# Altium footprint library PCB_Footprints.PcbLib: 303 footprints (part 8 of 19)
Each footprint in its own frame and in the unit in brackets; x right, y up, seen from the top. Pads: shape width x height; smd on the part's side, far side on the other; paste and mask are expansions set on the pad; w line width, h text height; cw(c..) or ccw(c..) is an arc to the next point about the centre after c.
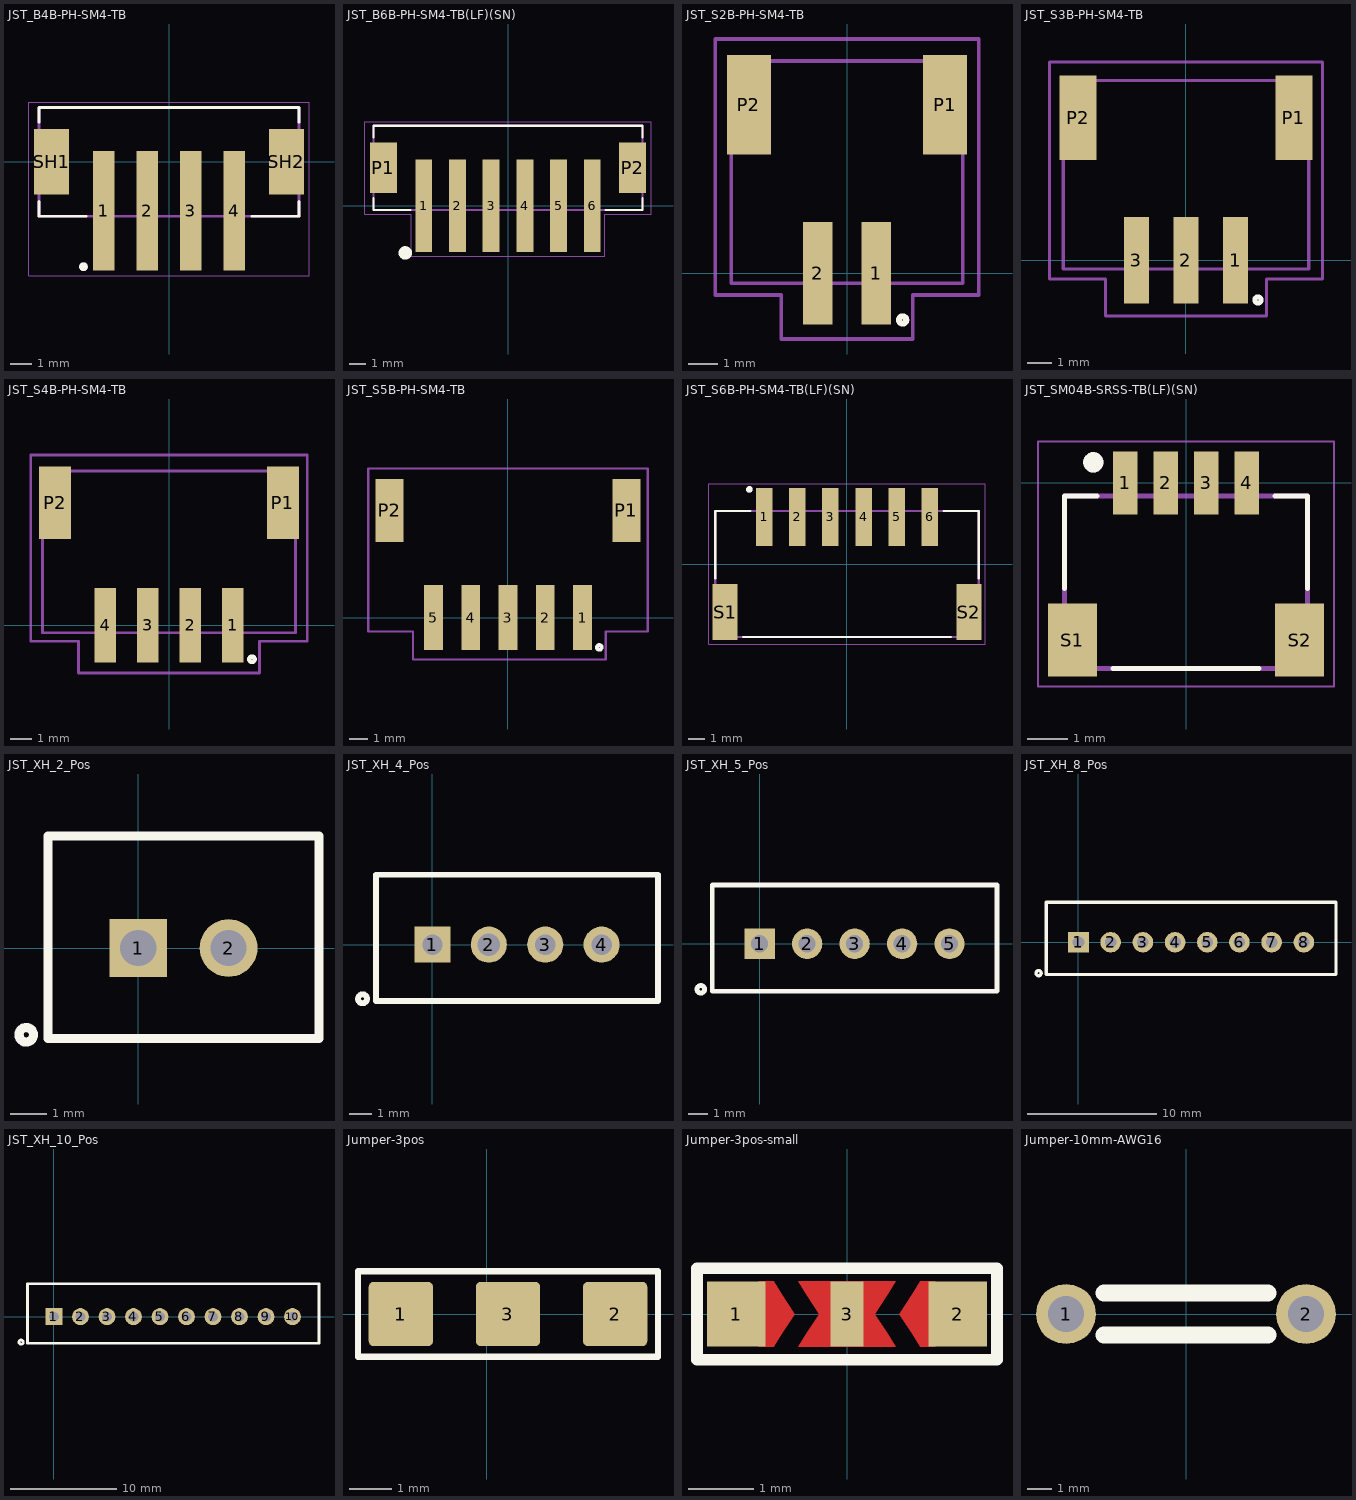
[diagram p7: the footprints below, top view; thin cyan lines are the x and y axes]

## JST_B4B-PH-SM4-TB [mm]
height 6.6
pads (6):
  rect 1x5.5 smd mask+0.05: 1(-3,-2.25) 2(-1,-2.25) 3(1,-2.25) 4(3,-2.25)
  rect 1.6x3 smd mask+0.05: SH1(-5.4,0) SH2(5.4,0)
Top Overlay:
  circle w0.2: c-3.937,-4.826 r0.1
  lines w0.127: -5.975,-1.82 -5.975,-2.5 -3.82,-2.5 ; -5.975,1.82 -5.975,2.5 5.975,2.5 5.975,1.82 ; 3.82,-2.5 5.975,-2.5 5.975,-1.82
Mechanical 13:
  circle w0.2: c-3.937,-4.826 r0.1
  lines w0.127: -5.975,-2.5 -5.975,2.5 5.975,2.5 5.975,-2.5 -5.975,-2.5
Mechanical 15:
  lines w0.05: -6.45,-5.25 6.45,-5.25 6.45,2.75 -6.45,2.75 -6.45,-5.25
3D body "step_temp.STEP": height 6.75, standoff 0, extent -5.975,-4.5 5.975,2.5

## JST_B6B-PH-SM4-TB(LF)(SN) [mm]
pads (8):
  rect 1x5.5 smd: 1(-5,0) 2(-3,0) 3(-1,0) 4(1,0) 5(3,0) 6(5,0)
  rect 1.6x3 smd: P1(-7.4,2.25) P2(7.4,2.25)
Top Overlay:
  circle w0.4: c-6.096,-2.794 r0.2
  lines w0.127: -7.975,0.45 -7.975,-0.25 -5.8,-0.25 ; -7.975,4.05 -7.975,4.75 7.975,4.75 7.975,4.05 ; 5.8,-0.25 7.975,-0.25 7.975,0.45
Mechanical 13:
  lines w0.127: -7.975,-0.25 7.975,-0.25 7.975,4.75 -7.975,4.75 -7.975,-0.25
Mechanical 15:
  lines w0.05: -8.5,-0.5 -5.75,-0.5 -5.75,-3 5.75,-3 5.75,-0.5 8.5,-0.5 8.5,5 -8.5,5 -8.5,-0.5
3D body "B6B-PH-SM4-TB_LF__SN_.step": height 6.6, standoff -0.15, extent -7.949,-2.286 8.001,4.714

## JST_S2B-PH-SM4-TB [mm]
pads (4):
  rect 1x3.5 smd: 1(1,0) 2(-1,0)
  rect 1.5x3.4 smd: P1(3.35,5.75) P2(-3.35,5.75)
Top Overlay:
  circle w0.2: c1.9,-1.6 r0.127
Mechanical 13:
  lines w0.127: -3.95,-0.35 3.95,-0.35 3.95,7.25 -3.95,7.25 -3.95,-0.35
Mechanical 15:
  lines w0.127: -4.5,-0.75 -2.25,-0.75 -2.25,-2.25 2.25,-2.25 2.25,-0.75 4.5,-0.75 4.5,8 -4.5,8 -4.5,-0.75
3D body "S2B-PH-SM4-TB--3DModel-STEP-269445.STEP": height 5.5, standoff -0.1, extent -3.963,-1.379 3.937,7.221

## JST_S3B-PH-SM4-TB [mm]
pads (5):
  rect 1x3.5 smd: 1(2,0) 2(0,0) 3(-2,0)
  rect 1.5x3.4 smd: P1(4.35,5.75) P2(-4.35,5.75)
Top Overlay:
  circle w0.2: c2.9,-1.6 r0.127
Mechanical 13:
  lines w0.127: -4.95,-0.35 -4.95,7.25 4.95,7.25 4.95,-0.35 -4.95,-0.35
Mechanical 15:
  lines w0.127: -5.5,-0.75 -5.5,8 5.5,8 5.5,-0.75 3.25,-0.75 3.25,-2.25 -3.25,-2.25 -3.25,-0.75 -5.5,-0.75
3D body "S3B-PH-SM4-TB--3DModel-STEP-269445.STEP": height 5.5, standoff -0.1, extent -4.95,-1.361 4.95,7.239

## JST_S4B-PH-SM4-TB [mm]
pads (6):
  rect 1x3.5 smd: 1(3,0) 2(1,0) 3(-1,0) 4(-3,0)
  rect 1.5x3.4 smd: P1(5.35,5.75) P2(-5.35,5.75)
Top Overlay:
  circle w0.2: c3.9,-1.6 r0.127
Mechanical 13:
  lines w0.127: -5.95,-0.35 -5.95,7.25 5.95,7.25 5.95,-0.35 -5.95,-0.35
Mechanical 15:
  lines w0.127: -6.5,-0.75 -6.5,8 6.5,8 6.5,-0.75 4.25,-0.75 4.25,-2.25 -4.25,-2.25 -4.25,-0.75 -6.5,-0.75
3D body "S4B-PH-SM4-TB--3DModel-STEP-56544.STEP": height 5.5, standoff -0.1, extent -5.95,-1.379 5.95,7.221

## JST_S5B-PH-SM4-TB [mm]
pads (7):
  rect 1x3.5 smd: 1(4,0) 2(2,0) 3(0,0) 4(-2,0) 5(-4,0)
  rect 1.5x3.4 smd: P1(6.35,5.75) P2(-6.35,5.75)
Top Overlay:
  circle w0.2: c4.9,-1.6 r0.127
Mechanical 15:
  lines w0.127: -7.493,-0.75 -5.096,-0.75 -5.096,-2.25 5.25,-2.25 5.25,-0.75 7.5,-0.75 7.5,8 -7.493,8 -7.493,-0.75
3D body "S5B-PH-SM4-TB--3DModel-STEP-56544.STEP": height 5.6, standoff 0, extent -6.95,-1.143 6.95,7.457

## JST_S6B-PH-SM4-TB(LF)(SN) [mm]
pads (8):
  rect 1x3.5 smd: 1(-5,2.875) 2(-3,2.875) 3(-1,2.875) 4(1,2.875) 5(3,2.875) 6(5,2.875)
  rect 1.5x3.4 smd: S1(-7.35,-2.875) S2(7.35,-2.875)
Top Overlay:
  circle w0.3: c-5.889,4.526 r0.05
  lines w0.127: -7.95,-0.855 -7.95,3.225 -5.82,3.225 ; -6.28,-4.375 6.28,-4.375 ; 5.82,3.225 7.95,3.225 7.95,-0.855
Mechanical 13:
  lines w0.127: -7.95,-4.375 -7.95,3.225 7.95,3.225 7.95,-4.375 -7.95,-4.375
  lines w0.3: -5.926,4.492 ccw(c-5.889,4.526) -5.839,4.526
Mechanical 15:
  lines w0.05: -8.35,-4.825 -8.35,4.875 8.35,4.875 8.35,-4.825 -8.35,-4.825
3D body "S6B-PH-SM4-TB(LF)(SN)--3DModel-STEP-56544.STEP": height 5.5, standoff -0.1, extent -7.87,-4.346 8.03,4.254

## JST_SM04B-SRSS-TB(LF)(SN) [mm]
pads (6):
  rect 0.6x1.55 smd: 1(-1.5,0) 2(-0.5,0) 3(0.5,0) 4(1.5,0)
  rect 1.2x1.8 smd: S1(-2.8,-3.875) S2(2.8,-3.875)
Top Overlay:
  circle w0.3: c-2.286,0.508 r0.1
  lines w0.127: -3,-2.6 -3,-0.325 -2.2,-0.325 ; -1.8,-4.575 1.8,-4.575 ; 2.2,-0.325 3,-0.325 3,-2.6
Mechanical 13:
  circle w0.3: c-2.286,0.508 r0.1
  lines w0.127: -3,-4.575 3,-4.575 3,-0.325 -3,-0.325 -3,-4.575
Mechanical 15:
  lines w0.05: -3.65,-5.025 3.65,-5.025 3.65,1.025 -3.65,1.025 -3.65,-5.025
3D body "SM04B-SRSS-TB_LF__SN_.step": height 2.96, standoff 0, extent -3,-4.572 3,0.377

## JST_XH_2_Pos [mm]
pads (2):
  rect 1.6x1.6 hole 1: 1(0,0)
  round 1.6 hole 1: 2(2.5,0)
Top Overlay:
  circle w0.254: c-3.1,-2.4 r0.2
  lines w0.254: -2.5,-2.5 -2.5,3.1 5,3.1 5,-2.5 -2.5,-2.5
3D body "B2B-XH-A-LF.STEP": height 7, standoff -3.4, extent -2.45,-2.35 4.95,3.4

## JST_XH_4_Pos [mm]
pads (4):
  rect 1.6x1.6 hole 0.9: 1(0,0)
  round 1.6 hole 1: 2(2.5,0)
  round 1.6 hole 0.9: 3(5,0) 4(7.5,0)
Top Overlay:
  circle w0.254: c-3.1,-2.4 r0.2
  lines w0.254: -2.5,-2.5 10,-2.5 10,3.1 -2.5,3.1 -2.5,-2.5
3D body "B4B-XH-A-LF--SN.STEP": height 7, standoff -3.4, extent -2.45,-2.35 9.95,3.4

## JST_XH_5_Pos [mm]
pads (5):
  rect 1.6x1.6 hole 0.9: 1(0,0)
  round 1.6 hole 0.9: 2(2.5,0) 3(5,0) 4(7.5,0) 5(10,0)
Top Overlay:
  circle w0.254: c-3.1,-2.4 r0.2
  lines w0.254: -2.5,-2.5 12.5,-2.5 12.5,3.1 -2.5,3.1 -2.5,-2.5
3D body "B5B-XH-A.STEP": height 7, standoff -3.4, extent -2.45,-2.375 12.45,3.375

## JST_XH_8_Pos [mm]
pads (8):
  rect 1.6x1.6 hole 0.9: 1(0,0)
  round 1.6 hole 0.9: 2(2.5,0) 3(5,0) 4(7.5,0) 5(10,0) 6(12.5,0) 7(15,0) 8(17.5,0)
Top Overlay:
  circle w0.254: c-3.1,-2.4 r0.2
  lines w0.254: -2.5,-2.5 -2.5,3.1 12.5,3.1 20,3.1 20,2.5 20,-2.5 12.5,-2.5 -2.5,-2.5
3D body "B8B-XH-A_LF__SN_.step": height 7, standoff -3.4, extent -2.5,-2.5 19.9,3.25

## JST_XH_10_Pos [mm]
pads (10):
  rect 1.6x1.6 hole 0.9: 1(0,0)
  round 1.6 hole 0.9: 2(2.5,0) 3(5,0) 4(7.5,0) 5(10,0) 6(12.5,0) 7(15,0) 8(17.5,0) 9(20,0) 10(22.5,0)
Top Overlay:
  circle w0.254: c-3.1,-2.4 r0.2
  lines w0.254: -2.5,-2.5 12.5,-2.5 25,-2.5 25,2.5 25,3.1 20,3.1 12.5,3.1 -2.5,3.1 -2.5,-2.5
3D body "B10B-XH-A_LF__SN_.step": height 7, standoff -3.4, extent -2.45,-2.65 24.95,3.1

## Jumper-3pos [mm] "3 pos selection"
pads (3):
  rrect15% 1.5x1.5 smd: 1(-2,0) 2(3,0) 3(0.5,0)
Top Overlay:
  lines w0.15: -3,-1 -3,1 4,1 4,-1 -3,-1

## Jumper-3pos-small [mm] "3 pos selection"
pads (3):
  rect 0.9x1 smd paste-1 mask+0.102: 1(-1.7,0) 2(1.7,0)
  rect 0.5x1 smd paste-1 mask+0.102: 3(0,0)
Top Layer:
  region: 0,0.5 0.75,0.5 0.625,0.3 0.425,0 0.625,-0.3 0.75,-0.5 0,-0.5
  region: 1.35,0.5 1.125,0.5 1,0.3 0.8,0 1,-0.3 1.125,-0.5 1.35,-0.5
  region: 0,0.5 -0.75,0.5 -0.625,0.3 -0.425,0 -0.625,-0.3 -0.75,-0.5 0,-0.5
  region: -1.35,0.5 -1.125,0.5 -1,0.3 -0.8,0 -1,-0.3 -1.125,-0.5 -1.35,-0.5
Top Overlay:
  lines w0.18: -2.3,-0.7 -2.3,0.7 2.3,0.7 2.3,-0.7 -2.3,-0.7
Top Solder:
  region: 0.35,0.5 1.35,0.5 1.35,-0.5 0.35,-0.5
  region: -1.25,0.5 -0.25,0.5 -0.25,-0.5 -1.25,-0.5

## Jumper-10mm-AWG16 [mm] "Through-hole jumper for AWG16 wire"
pads (2):
  round 2.5 hole 1.5 unplated: 1(-5,0) 2(5,0)
Top Overlay:
  lines w0.7: -3.425,-0.875 3.425,-0.875 ; -3.425,0.875 3.425,0.875
3D body: height 1.4, standoff 0, extent -5.1,-0.7 4.9,0.7